# Altium footprint library tianxiaohua_PcbLib.PcbLib: 138 footprints (part 4 of 9)
Each footprint in its own frame and in the unit in brackets; x right, y up, seen from the top. Pads: shape width x height; smd on the part's side, far side on the other; paste and mask are expansions set on the pad; w line width, h text height; cw(c..) or ccw(c..) is an arc to the next point about the centre after c.
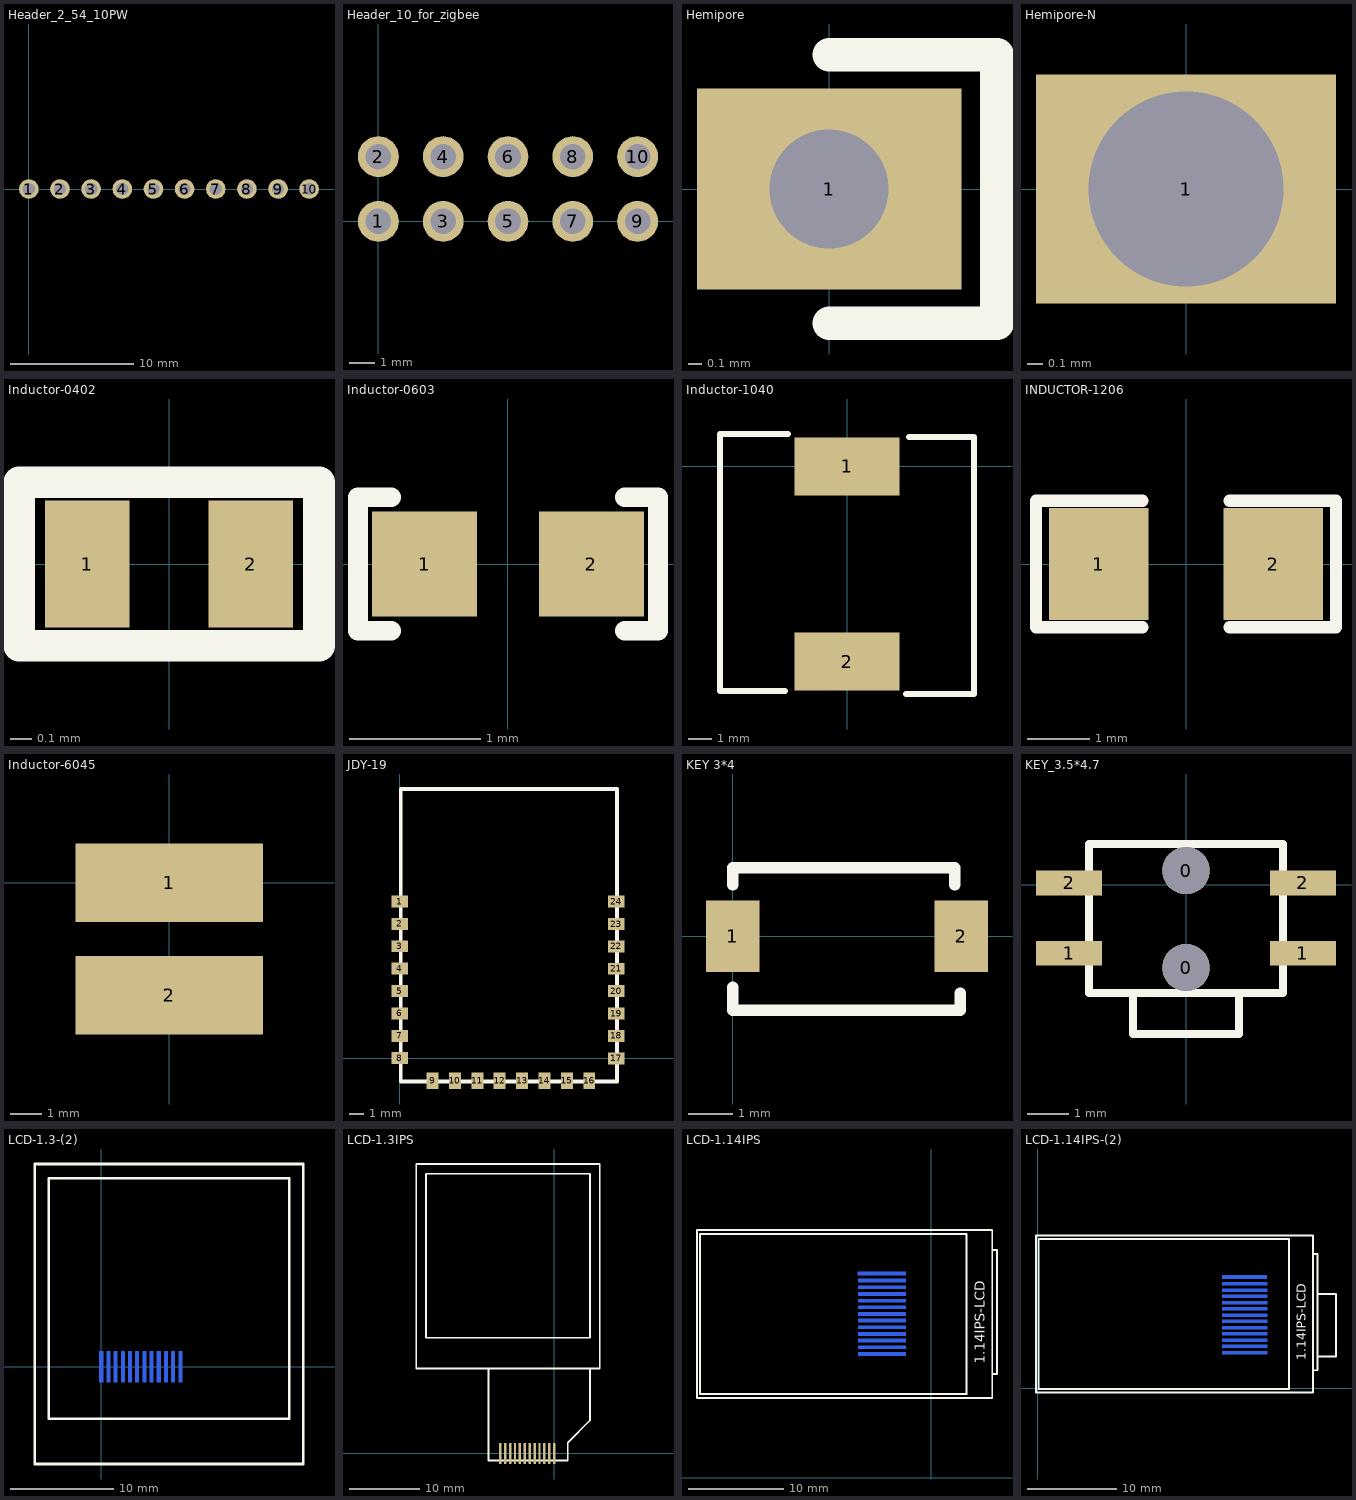
[diagram p3: the footprints below, top view; thin cyan lines are the x and y axes]

## Header_2_54_10PW [mm] "弯的排针"
pads (10):
  round 1.6 hole 1: 1(0,0) 2(2.54,0) 3(5.08,0) 4(7.62,0) 5(10.16,0) 6(12.7,0) 7(15.24,0) 8(17.78,0) 9(20.318,0) 10(22.858,0)
3D body "HEADER 2_54 HORIZONTAL 2X.step": height 2.75, standoff -1.75, extent 13.97,-10.066 19.05,0.254
3D body "HEADER 2_54 HORIZONTAL 2X.step": height 2.75, standoff -1.75, extent 8.89,-10.066 13.97,0.254
3D body "HEADER 2_54 HORIZONTAL 2X.step": height 2.75, standoff -1.75, extent 3.81,-10.066 8.89,0.254
3D body "HEADER 2_54 HORIZONTAL 2X.step": height 2.75, standoff -1.75, extent -1.27,-10.066 3.81,0.254
3D body "HEADER 2_54 HORIZONTAL 2X.step": height 2.75, standoff -1.75, extent 19.048,-10.066 24.128,0.254

## Header_10_for_zigbee [mm]
pads (10):
  round 1.6 hole 1: 1(0,0) 2(0,2.54) 3(2.54,0) 4(2.54,2.54) 5(5.08,0) 6(5.08,2.54) 7(7.62,0) 8(7.62,2.54) 9(10.16,0) 10(10.16,2.54)
3D body "HEADER 2_54 HORIZONTAL 2X.step": height 2.75, standoff -1.75, extent 3.81,-10.066 8.89,0.254
3D body "HEADER 2_54 HORIZONTAL 2X.step": height 2.75, standoff -1.75, extent -1.27,-10.066 3.81,0.254
3D body "HEADER 2_54 HORIZONTAL 2X.step": height 5.29, standoff 0.79, extent -1.27,-7.526 3.81,2.794
3D body "HEADER 2_54 HORIZONTAL 2X.step": height 5.29, standoff 0.79, extent 3.81,-7.526 8.89,2.794
3D body "HEADER 2_54 HORIZONTAL 2X.step": height 2.75, standoff -1.75, extent 6.35,-10.066 11.43,0.254
3D body "HEADER 2_54 HORIZONTAL 2X.step": height 5.29, standoff 0.79, extent 6.35,-7.526 11.43,2.794

## Hemipore [mm] "半孔(邮票孔)"
pads (1):
  rect 2x1.524 hole 0.9: 1(0,0)
Top Overlay:
  lines w0.254: 0,-1.016 1.27,-1.016 1.27,1.016 0,1.016

## Hemipore-N [mm] "半孔(邮票孔)"
pads (1):
  rect 2x1.524 hole 1.3: 1(0,0)

## Inductor-0402 [mm]
pads (2):
  rect 0.4x0.6 smd: 1(-0.387,0) 2(0.387,0)
Top Overlay:
  lines w0.15: -0.71,-0.387 -0.71,0.387 0.71,0.387 0.71,-0.387 -0.71,-0.387
3D body "User Library-d0402h025.step": height 0.25, standoff 0, extent -0.5,-0.25 0.5,0.25

## Inductor-0603 [mm]
pads (2):
  rect 0.8x0.8 smd: 1(-0.635,0) 2(0.635,0)
Top Overlay:
  lines w0.15: -0.889,-0.508 -1.143,-0.508 -1.143,0.254 -1.143,0.508 -0.889,0.508 ; 0.889,-0.508 1.143,-0.508 1.143,0.254 1.143,0.508 0.889,0.508
3D body "CircuitWorks-RESISTOR 0603.step": height 0.48, standoff -0.03, extent -0.8,-0.43 0.8,0.43

## Inductor-1040 [mm]
pads (2):
  rect 4.5x2.5 smd: 1(0,0) 2(0,-8.382)
Top Overlay:
  lines w0.254: -2.667,-9.652 -5.461,-9.652 -5.461,1.397 -2.54,1.397 ; 2.54,-9.779 5.461,-9.779 5.461,1.27 2.667,1.27
3D body "1040-inductor.step": height 3.9, standoff 0, extent -5,-9.391 5,1.009

## INDUCTOR-1206 [mm] "电感"
pads (2):
  rect 1.6x1.8 smd: 1(-1.4,0) 2(1.4,0)
Top Overlay:
  lines w0.2: -0.7,-1.016 -2.413,-1.016 -2.413,1.016 -0.7,1.016 ; 0.7,-1.016 2.413,-1.016 2.413,1.016 0.7,1.016
3D body "User Library-Vhip cap 1206.step": height 1.77, standoff 0.03, extent -1.6,-0.85 1.6,0.85

## Inductor-6045 [mm] "电感"
pads (2):
  rect 6x2.5 smd: 1(0,0) 2(0,-3.6)
3D body "User Library-SRN6045 Series.STEP": height 4.5, standoff 0, extent -3,-4.928 3,1.372

## JDY-19 [mm]
pads (24):
  rect 1.1x0.8 smd: 1(0,10.513) 2(0,9.013) 3(0,7.514) 4(0,6.014) 5(0,4.514) 6(0,3.014) 7(0,1.514) 8(0,0.014) 17(14.513,0.006) 18(14.513,1.506) 19(14.513,3.006) 20(14.513,4.506) 21(14.513,6.006) 22(14.513,7.506) 23(14.513,9.006) 24(14.513,10.513)
  rect 0.8x1.1 smd: 9(2.2,-1.5) 10(3.7,-1.5) 11(5.2,-1.5) 12(6.7,-1.5) 13(8.2,-1.5) 14(9.7,-1.5) 15(11.2,-1.5) 16(12.7,-1.5)
Top Overlay:
  lines w0.254: 0.065,-1.548 0.065,18.052 14.564,18.052 14.564,-1.548 0.065,-1.548
3D body: height 1.5, standoff 0, extent 0.065,-1.548 14.577,18.06

## KEY 3*4 [mm]
pads (2):
  rect 1.2x1.6 smd: 1(0,0) 2(5.1,0)
Top Overlay:
  lines w0.254: 0,-1.143 0,-1.651 5.08,-1.651 5.08,-1.27 ; 0,1.143 0,1.5 ; 0,1.524 4.953,1.524 4.953,1.143
3D body: height 2.01, standoff 0.01, extent 1.548,-1.125 3.54,0.871
3D body: height 1.5, standoff 0, extent 0.254,-1.714 4.699,1.46

## KEY_3.5*4.7 [mm]
pads (6):
  round 1.143 hole 1.143: 0(0,-2) 0(0,0.35)
  rect 1.6x0.6 smd: 1(-2.832,-1.651) 1(2.832,-1.651) 2(-2.832,0.051) 2(2.832,0.051)
Top Overlay:
  lines w0.2: -1.283,-2.636 -1.283,-3.606 1.283,-3.606 1.283,-2.636 ; -2.349,-2.616 -2.349,0.991 2.349,0.991 2.349,-2.616 -2.349,-2.616
3D body "零": height 1.63, standoff -0.02, extent -2.941,-3.606 2.959,0.894

## LCD-1.3-(2) [mm]
pads (12):
  rect 0.35x3 smd far side: 1(0,0) 2(0.7,0) 3(1.4,0) 4(2.1,0) 5(2.8,0) 6(3.5,0) 7(4.2,0) 8(4.9,0) 9(5.6,0) 10(6.3,0) 11(7,0) 12(7.7,0)
Top Overlay:
  lines w0.254: -6.488,-9.451 3.812,-9.451 ; 9.38,-9.455 -5.096,-9.455 -6.488,-9.455 ; -6.488,-9.455 19.68,-9.455 19.68,19.74 -6.488,19.74 -6.488,-9.455 ; -5.112,-5.056 -5.112,18.344 18.288,18.344 18.288,-5.056 -5.112,-5.056
Bottom Overlay:
  lines w0.254: -5.096,-9.455 -5.096,-4.064 -1.935,-0.903 -1.935,1.649 ; -1.935,1.645 9.38,1.645 9.38,-9.455
3D body: height 4.01, standoff 2.5, extent -5.095,-5.095 18.253,18.318
3D body: height 3.5, standoff 2, extent -6.45,-9.417 19.673,19.737

## LCD-1.3IPS [mm]
pads (12):
  rect 0.35x3 smd: 1(0,0) 2(-0.7,0) 3(-1.4,0) 4(-2.1,0) 5(-2.8,0) 6(-3.5,0) 7(-4.2,0) 8(-4.9,0) 9(-5.6,0) 10(-6.3,0) 11(-7,0) 12(-7.7,0)
Top Overlay:
  lines w0.254: -19.68,12.13 -9.38,12.13 -9.38,-1 1.935,-1 ; 1.935,-1.004 1.935,1.548 5.096,4.709 5.096,12.126 ; -19.68,12.126 -19.68,41.321 6.488,41.321 6.488,12.126 -19.68,12.126 ; -18.304,16.525 5.096,16.525 5.096,39.925 -18.304,39.925 -18.304,16.525
3D body: height 1.51, standoff 0, extent -18.318,16.512 5.095,39.925
3D body: height 1.5, standoff 0, extent -19.673,12.126 6.515,41.28

## LCD-1.14IPS [mm] "1.14寸IPS-LCD裸屏SPI接口"
pads (13):
  rect 5x0.35 smd far side: 1(-5.207,21.463) 2(-5.176,20.7) 3(-5.176,20) 4(-5.176,19.3) 5(-5.176,18.6) 6(-5.176,17.9) 7(-5.176,17.2) 8(-5.176,16.5) 9(-5.176,15.8) 10(-5.176,15.1) 11(-5.176,14.4) 12(-5.176,13.7) 13(-5.176,13)
Top Overlay:
  lines w0.203: 6.4,10.9 6.9,10.9 6.9,23.9 6.4,23.9 ; -24.6,8.4 6.4,8.4 6.4,26 -24.6,26 -24.6,8.4 ; -24.31,8.8 -24.3,8.81 -24.3,25.6 3.71,25.6 3.71,8.81 3.7,8.8 -24.31,8.8
  text "1.14IPS-LCD" at 5.6,12 h1.02
Bottom Overlay:
  lines w0.203: -3.092,21.9 -8.509,21.9 -8.509,12.5 6.4,12.5 6.4,19.4 -1.1,19.4 -1.725,20.025 -2.467,21.402 -3.092,22.027
3D body: height 3.26, standoff 3, extent -24.13,8.954 3.556,25.4
3D body: height 3.25, standoff 3, extent -24.511,8.509 6.223,25.781

## LCD-1.14IPS-(2) [mm]
pads (13):
  rect 5x0.35 smd far side: 1(23.114,12.446) 2(23.145,11.683) 3(23.145,10.983) 4(23.145,10.283) 5(23.145,9.583) 6(23.145,8.883) 7(23.145,8.183) 8(23.145,7.483) 9(23.145,6.783) 10(23.145,6.083) 11(23.145,5.383) 12(23.145,4.683) 13(23.145,3.983)
Top Overlay:
  lines w0.203: 30.784,2.01 31.284,2.01 31.284,15.01 30.784,15.01 ; -0.216,-0.49 30.784,-0.49 30.784,17.11 -0.216,17.11 -0.216,-0.49 ; 0.074,-0.09 0.084,-0.08 0.084,16.71 28.094,16.71 28.094,-0.08 28.084,-0.09 0.074,-0.09
  lines w0.254: 31.369,3.556 33.369,3.556 33.369,10.541 31.369,10.541
  text "1.14IPS-LCD" at 29.984,3.11 h1.02
Bottom Overlay:
  lines w0.203: 25.483,13.01 20.066,13.01 20.066,3.61 30.784,3.61 30.784,10.51 27.475,10.51 26.85,11.135 26.108,12.512 25.483,13.137 ; 30.015,3.579 33.324,3.579 33.324,10.591 ; 30.015,10.51 33.324,10.51
3D body: height 3.26, standoff 3, extent 0.254,0.064 27.94,16.51
3D body: height 3.25, standoff 3, extent -0.127,-0.381 30.607,16.891